# Altium integrated library GPDSE.IntLib: 634 symbols (part 3 of 7) (continued)
## ATmega328A-PU (continued)

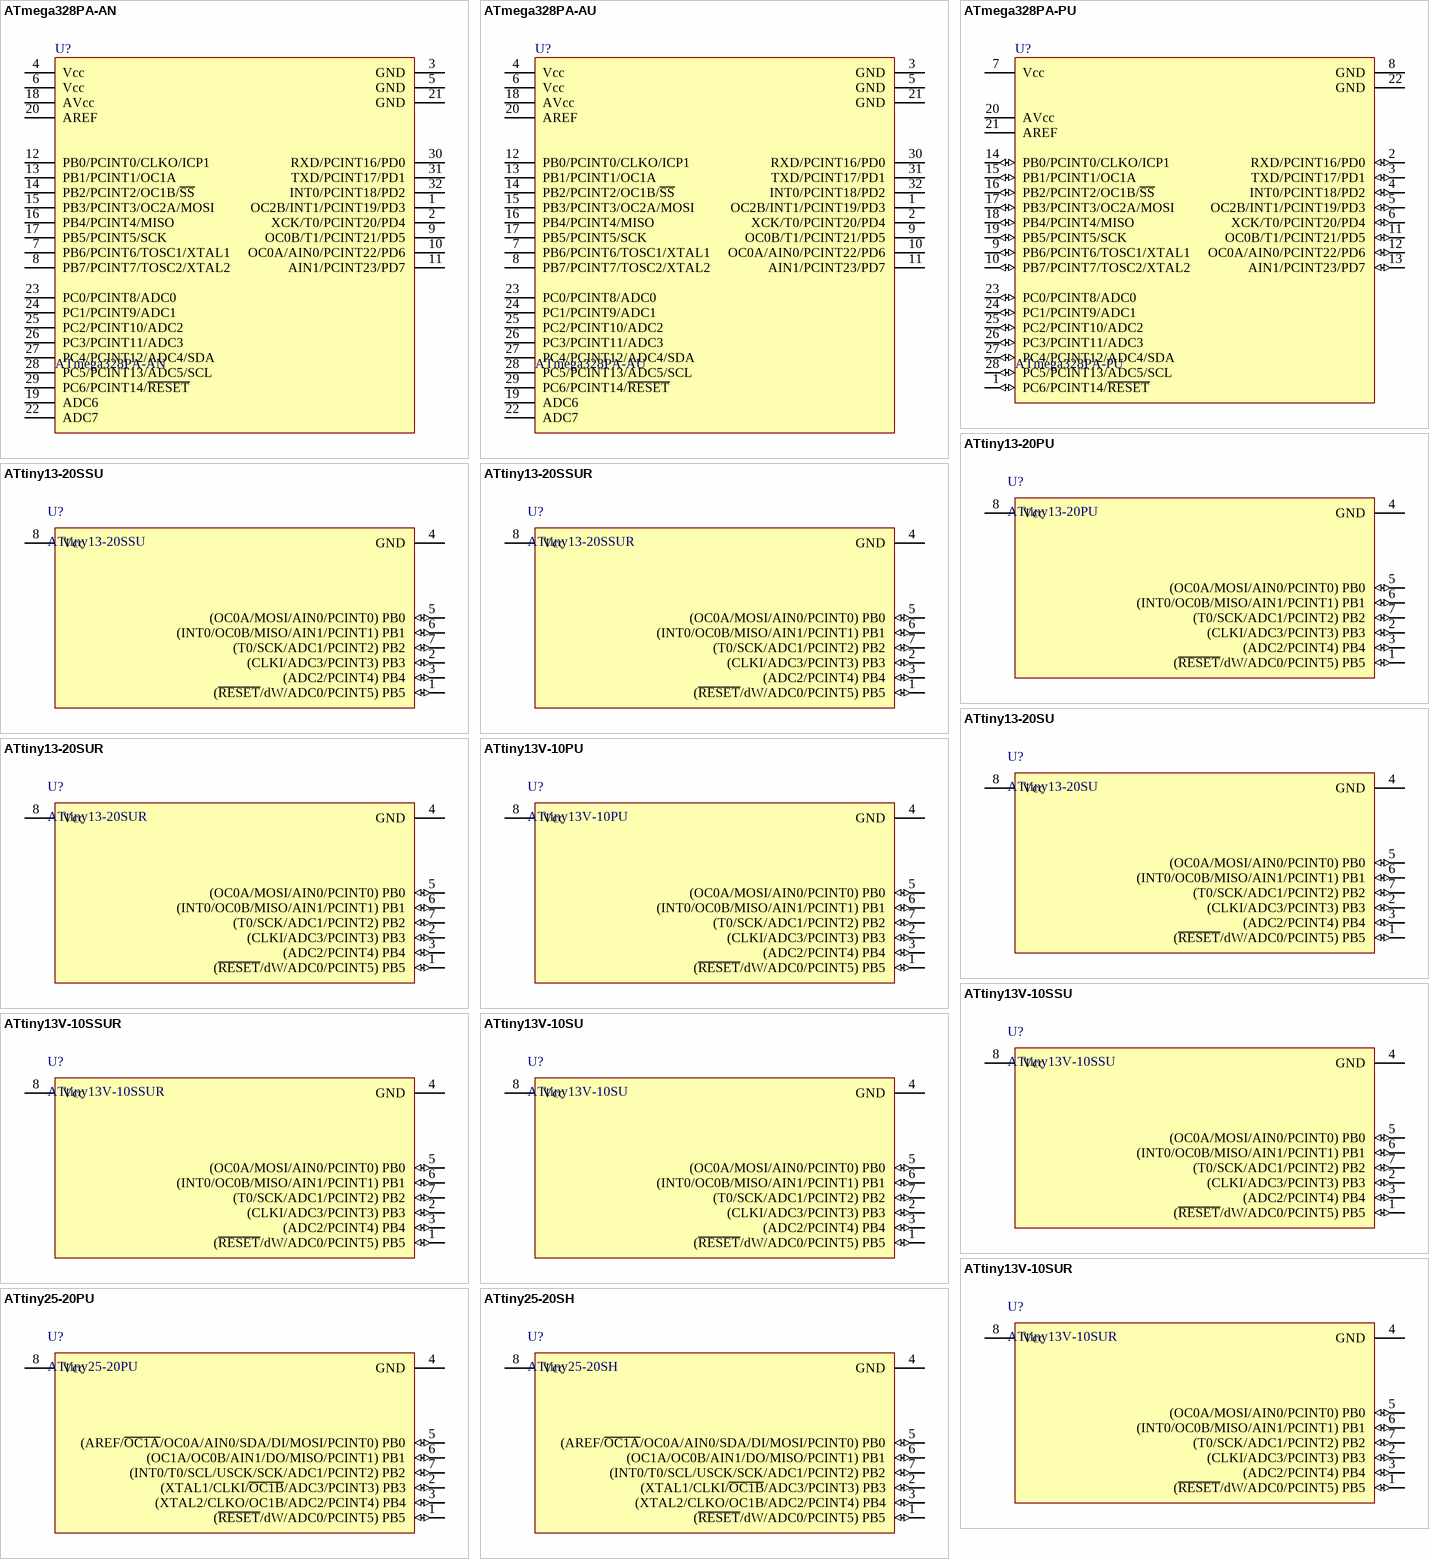
[diagram p15: symbols ATmega328PA-AN to ATtiny25-20SH]

## ATmega328PA-AN
designator U?
8-bit AVR Microcontroller with 32 KB In-System Programmable Flash; Flash Memory: 32 KB; EEPROM Memory: 1 KB; SRAM Memory: 2 KB; Timer 8 bits: 2; Timer 16 bits: 1; PWM Channel: 6; ADC Channel: 8; I/O Pins: 23; Supply Voltage (Vdd): 1.8 - 5.5 V; Clock Frequency: 0 - 20 MHz; Debug: debugWire; Serial USART: 1; Serial SPI: 1; Serial I2C: 1; Analog Comparator: 1
footprint QFP32-7.0mm(0.8mm)
pins: 1 OC2B/INT1/PCINT19/PD3, 2 XCK/T0/PCINT20/PD4, 3 GND, 4 Vcc, 5 GND, 6 Vcc, 7 PB6/PCINT6/TOSC1/XTAL1, 8 PB7/PCINT7/TOSC2/XTAL2, 9 OC0B/T1/PCINT21/PD5, 10 OC0A/AIN0/PCINT22/PD6, 11 AIN1/PCINT23/PD7, 12 PB0/PCINT0/CLKO/ICP1, 13 PB1/PCINT1/OC1A, 14 PB2/PCINT2/OC1B/~{SS}, 15 PB3/PCINT3/OC2A/MOSI, 16 PB4/PCINT4/MISO, 17 PB5/PCINT5/SCK, 18 AVcc, 19 ADC6, 20 AREF, 21 GND, 22 ADC7, 23 PC0/PCINT8/ADC0, 24 PC1/PCINT9/ADC1, 25 PC2/PCINT10/ADC2, 26 PC3/PCINT11/ADC3, 27 PC4/PCINT12/ADC4/SDA, 28 PC5/PCINT13/ADC5/SCL, 29 PC6/PCINT14/~{RESET}, 30 RXD/PCINT16/PD0, 31 TXD/PCINT17/PD1, 32 INT0/PCINT18/PD2

## ATmega328PA-AU
designator U?
8-bit AVR Microcontroller with 32 KB In-System Programmable Flash; Flash Memory: 32 KB; EEPROM Memory: 1 KB; SRAM Memory: 2 KB; Timer 8 bits: 2; Timer 16 bits: 1; PWM Channel: 6; ADC Channel: 8; I/O Pins: 23; Supply Voltage (Vdd): 1.8 - 5.5 V; Clock Frequency: 0 - 20 MHz; Debug: debugWire; Serial USART: 1; Serial SPI: 1; Serial I2C: 1; Analog Comparator: 1
footprint QFP32-7.0mm(0.8mm)
pins: 1 OC2B/INT1/PCINT19/PD3, 2 XCK/T0/PCINT20/PD4, 3 GND, 4 Vcc, 5 GND, 6 Vcc, 7 PB6/PCINT6/TOSC1/XTAL1, 8 PB7/PCINT7/TOSC2/XTAL2, 9 OC0B/T1/PCINT21/PD5, 10 OC0A/AIN0/PCINT22/PD6, 11 AIN1/PCINT23/PD7, 12 PB0/PCINT0/CLKO/ICP1, 13 PB1/PCINT1/OC1A, 14 PB2/PCINT2/OC1B/~{SS}, 15 PB3/PCINT3/OC2A/MOSI, 16 PB4/PCINT4/MISO, 17 PB5/PCINT5/SCK, 18 AVcc, 19 ADC6, 20 AREF, 21 GND, 22 ADC7, 23 PC0/PCINT8/ADC0, 24 PC1/PCINT9/ADC1, 25 PC2/PCINT10/ADC2, 26 PC3/PCINT11/ADC3, 27 PC4/PCINT12/ADC4/SDA, 28 PC5/PCINT13/ADC5/SCL, 29 PC6/PCINT14/~{RESET}, 30 RXD/PCINT16/PD0, 31 TXD/PCINT17/PD1, 32 INT0/PCINT18/PD2

## ATmega328PA-PU
designator U?
8-bit AVR Microcontroller with 32 KB In-System Programmable Flash; Flash Memory: 32 KB; EEPROM Memory: 1 KB; SRAM Memory: 2 KB; Timer 8 bits: 2; Timer 16 bits: 1; PWM Channel: 6; I/O Pins: 23; Supply Voltage (Vdd): 1.8 - 5.5 V; Clock Frequency: 0 - 20 MHz; Debug: debugWire; ADC Channel: 6; Serial USART: 1; Serial SPI: 1; Serial I2C: 1; Analog Comparator: 1
footprint DIP28-300(100) (DIP, 28-Leads, Row Spacing 7.62mm, Pitch 2.54mm, Body 34.67x7.3mm)
pins: 1 PC6/PCINT14/~{RESET} (io), 2 RXD/PCINT16/PD0 (io), 3 TXD/PCINT17/PD1 (io), 4 INT0/PCINT18/PD2 (io), 5 OC2B/INT1/PCINT19/PD3 (io), 6 XCK/T0/PCINT20/PD4 (io), 7 Vcc, 8 GND, 9 PB6/PCINT6/TOSC1/XTAL1 (io), 10 PB7/PCINT7/TOSC2/XTAL2 (io), 11 OC0B/T1/PCINT21/PD5 (io), 12 OC0A/AIN0/PCINT22/PD6 (io), 13 AIN1/PCINT23/PD7 (io), 14 PB0/PCINT0/CLKO/ICP1 (io), 15 PB1/PCINT1/OC1A (io), 16 PB2/PCINT2/OC1B/~{SS} (io), 17 PB3/PCINT3/OC2A/MOSI (io), 18 PB4/PCINT4/MISO (io), 19 PB5/PCINT5/SCK (io), 20 AVcc, 21 AREF, 22 GND, 23 PC0/PCINT8/ADC0 (io), 24 PC1/PCINT9/ADC1 (io), 25 PC2/PCINT10/ADC2 (io), 26 PC3/PCINT11/ADC3 (io), 27 PC4/PCINT12/ADC4/SDA (io), 28 PC5/PCINT13/ADC5/SCL (io)

## ATtiny13-20PU
designator U?
Atmel 8-bit AVR Microcontroller with 1 KB In-System Programmable Flash; ADC Channel: 4; Analog Comparator: 1; Clock Frequency: 0 - 20 MHz; Debug: debugWire; EEPROM Memory: 64 B; Flash Memory: 1 KB; I/O Pins: 6; PWM Channel: 2; Serial USI: 0; Supply Voltage (Vdd): 2.7 - 5.5 V; SRAM Memory: 64 B; Timer 8 bits: 1
footprint DIP08-300(100) (DIP; 8 Leads; Row Spacing 7.62 mm; Pitch 2.54 mm; 3D CircuitWorks)
pins: 1 (~{RESET}/dW/ADC0/PCINT5) PB5 (io), 2 (CLKI/ADC3/PCINT3) PB3 (io), 3 (ADC2/PCINT4) PB4 (io), 4 GND (power), 5 (OC0A/MOSI/AIN0/PCINT0) PB0 (io), 6 (INT0/OC0B/MISO/AIN1/PCINT1) PB1 (io), 7 (T0/SCK/ADC1/PCINT2) PB2 (io), 8 Vcc (power)

## ATtiny13-20SSU
designator U?
Atmel 8-bit AVR Microcontroller with 1 KB In-System Programmable Flash; ADC Channel: 4; Analog Comparator: 1; Clock Frequency: 0 - 20 MHz; Debug: debugWire; EEPROM Memory: 64 B; Flash Memory: 1 KB; I/O Pins: 6; PWM Channel: 2; Serial USI: 0; Supply Voltage (Vdd): 2.7 - 5.5 V; SRAM Memory: 64 B; Timer 8 bits: 1
footprint SOIC08-150(50) (SOIC 8 Leads; Row Spacing 3.81 mm; Pitch 1.27 mm; 3D André L´Hérault)
pins: 1 (~{RESET}/dW/ADC0/PCINT5) PB5 (io), 2 (CLKI/ADC3/PCINT3) PB3 (io), 3 (ADC2/PCINT4) PB4 (io), 4 GND (power), 5 (OC0A/MOSI/AIN0/PCINT0) PB0 (io), 6 (INT0/OC0B/MISO/AIN1/PCINT1) PB1 (io), 7 (T0/SCK/ADC1/PCINT2) PB2 (io), 8 Vcc (power)

## ATtiny13-20SSUR
designator U?
Atmel 8-bit AVR Microcontroller with 1 KB In-System Programmable Flash; ADC Channel: 4; Analog Comparator: 1; Clock Frequency: 0 - 20 MHz; Debug: debugWire; EEPROM Memory: 64 B; Flash Memory: 1 KB; I/O Pins: 6; PWM Channel: 2; Serial USI: 0; Supply Voltage (Vdd): 2.7 - 5.5 V; SRAM Memory: 64 B; Timer 8 bits: 1
footprint SOIC08-150(50) (SOIC 8 Leads; Row Spacing 3.81 mm; Pitch 1.27 mm; 3D André L´Hérault)
pins: 1 (~{RESET}/dW/ADC0/PCINT5) PB5 (io), 2 (CLKI/ADC3/PCINT3) PB3 (io), 3 (ADC2/PCINT4) PB4 (io), 4 GND (power), 5 (OC0A/MOSI/AIN0/PCINT0) PB0 (io), 6 (INT0/OC0B/MISO/AIN1/PCINT1) PB1 (io), 7 (T0/SCK/ADC1/PCINT2) PB2 (io), 8 Vcc (power)

## ATtiny13-20SU
designator U?
Atmel 8-bit AVR Microcontroller with 1 KB In-System Programmable Flash; ADC Channel: 4; Analog Comparator: 1; Clock Frequency: 0 - 20 MHz; Debug: debugWire; EEPROM Memory: 64 B; Flash Memory: 1 KB; I/O Pins: 6; PWM Channel: 2; Serial USI: 0; Supply Voltage (Vdd): 2.7 - 5.5 V; SRAM Memory: 64 B; Timer 8 bits: 1
footprint SOP08-5.3mm(1.27mm) (Small Outline Package 8 pin)
pins: 1 (~{RESET}/dW/ADC0/PCINT5) PB5 (io), 2 (CLKI/ADC3/PCINT3) PB3 (io), 3 (ADC2/PCINT4) PB4 (io), 4 GND (power), 5 (OC0A/MOSI/AIN0/PCINT0) PB0 (io), 6 (INT0/OC0B/MISO/AIN1/PCINT1) PB1 (io), 7 (T0/SCK/ADC1/PCINT2) PB2 (io), 8 Vcc (power)

## ATtiny13-20SUR
designator U?
Atmel 8-bit AVR Microcontroller with 1 KB In-System Programmable Flash; ADC Channel: 4; Analog Comparator: 1; Clock Frequency: 0 - 20 MHz; Debug: debugWire; EEPROM Memory: 64 B; Flash Memory: 1 KB; I/O Pins: 6; PWM Channel: 2; Serial USI: 0; Supply Voltage (Vdd): 2.7 - 5.5 V; SRAM Memory: 64 B; Timer 8 bits: 1
footprint SOP08-5.3mm(1.27mm) (Small Outline Package 8 pin)
pins: 1 (~{RESET}/dW/ADC0/PCINT5) PB5 (io), 2 (CLKI/ADC3/PCINT3) PB3 (io), 3 (ADC2/PCINT4) PB4 (io), 4 GND (power), 5 (OC0A/MOSI/AIN0/PCINT0) PB0 (io), 6 (INT0/OC0B/MISO/AIN1/PCINT1) PB1 (io), 7 (T0/SCK/ADC1/PCINT2) PB2 (io), 8 Vcc (power)

## ATtiny13V-10PU
designator U?
Atmel 8-bit AVR Microcontroller with 1 KB In-System Programmable Flash; ADC Channel: 4; Analog Comparator: 1; Clock Frequency: 0 - 10 MHz; Debug: debugWire; EEPROM Memory: 64 B; Flash Memory: 1 KB; I/O Pins: 6; PWM Channel: 2; Serial USI: 0; Supply Voltage (Vdd): 1.8 - 5.5 V; SRAM Memory: 64 B; Timer 8 bits: 1
footprint DIP08-300(100) (DIP; 8 Leads; Row Spacing 7.62 mm; Pitch 2.54 mm; 3D CircuitWorks)
pins: 1 (~{RESET}/dW/ADC0/PCINT5) PB5 (io), 2 (CLKI/ADC3/PCINT3) PB3 (io), 3 (ADC2/PCINT4) PB4 (io), 4 GND (power), 5 (OC0A/MOSI/AIN0/PCINT0) PB0 (io), 6 (INT0/OC0B/MISO/AIN1/PCINT1) PB1 (io), 7 (T0/SCK/ADC1/PCINT2) PB2 (io), 8 Vcc (power)

## ATtiny13V-10SSU
designator U?
Atmel 8-bit AVR Microcontroller with 1 KB In-System Programmable Flash; ADC Channel: 4; Analog Comparator: 1; Clock Frequency: 0 - 10 MHz; Debug: debugWire; EEPROM Memory: 64 B; Flash Memory: 1 KB; I/O Pins: 6; PWM Channel: 2; Serial USI: 0; Supply Voltage (Vdd): 1.8 - 5.5 V; SRAM Memory: 64 B; Timer 8 bits: 1
footprint SOIC08-150(50) (SOIC 8 Leads; Row Spacing 3.81 mm; Pitch 1.27 mm; 3D André L´Hérault)
pins: 1 (~{RESET}/dW/ADC0/PCINT5) PB5 (io), 2 (CLKI/ADC3/PCINT3) PB3 (io), 3 (ADC2/PCINT4) PB4 (io), 4 GND (power), 5 (OC0A/MOSI/AIN0/PCINT0) PB0 (io), 6 (INT0/OC0B/MISO/AIN1/PCINT1) PB1 (io), 7 (T0/SCK/ADC1/PCINT2) PB2 (io), 8 Vcc (power)

## ATtiny13V-10SSUR
designator U?
Atmel 8-bit AVR Microcontroller with 1 KB In-System Programmable Flash; ADC Channel: 4; Analog Comparator: 1; Clock Frequency: 0 - 10 MHz; Debug: debugWire; EEPROM Memory: 64 B; Flash Memory: 1 KB; I/O Pins: 6; PWM Channel: 2; Serial USI: 0; Supply Voltage (Vdd): 1.8 - 5.5 V; SRAM Memory: 64 B; Timer 8 bits: 1
footprint SOIC08-150(50) (SOIC 8 Leads; Row Spacing 3.81 mm; Pitch 1.27 mm; 3D André L´Hérault)
pins: 1 (~{RESET}/dW/ADC0/PCINT5) PB5 (io), 2 (CLKI/ADC3/PCINT3) PB3 (io), 3 (ADC2/PCINT4) PB4 (io), 4 GND (power), 5 (OC0A/MOSI/AIN0/PCINT0) PB0 (io), 6 (INT0/OC0B/MISO/AIN1/PCINT1) PB1 (io), 7 (T0/SCK/ADC1/PCINT2) PB2 (io), 8 Vcc (power)

## ATtiny13V-10SU
designator U?
Atmel 8-bit AVR Microcontroller with 1 KB In-System Programmable Flash; ADC Channel: 4; Analog Comparator: 1; Clock Frequency: 0 - 10 MHz; Debug: debugWire; EEPROM Memory: 64 B; Flash Memory: 1 KB; I/O Pins: 6; PWM Channel: 2; Serial USI: 0; Supply Voltage (Vdd): 1.8 - 5.5 V; SRAM Memory: 64 B; Timer 8 bits: 1
footprint SOP08-5.3mm(1.27mm) (Small Outline Package 8 pin)
pins: 1 (~{RESET}/dW/ADC0/PCINT5) PB5 (io), 2 (CLKI/ADC3/PCINT3) PB3 (io), 3 (ADC2/PCINT4) PB4 (io), 4 GND (power), 5 (OC0A/MOSI/AIN0/PCINT0) PB0 (io), 6 (INT0/OC0B/MISO/AIN1/PCINT1) PB1 (io), 7 (T0/SCK/ADC1/PCINT2) PB2 (io), 8 Vcc (power)

## ATtiny13V-10SUR
designator U?
Atmel 8-bit AVR Microcontroller with 1 KB In-System Programmable Flash; ADC Channel: 4; Analog Comparator: 1; Clock Frequency: 0 - 10 MHz; Debug: debugWire; EEPROM Memory: 64 B; Flash Memory: 1 KB; I/O Pins: 6; PWM Channel: 2; Serial USI: 0; Supply Voltage (Vdd): 1.8 - 5.5 V; SRAM Memory: 64 B; Timer 8 bits: 1
footprint SOP08-5.3mm(1.27mm) (Small Outline Package 8 pin)
pins: 1 (~{RESET}/dW/ADC0/PCINT5) PB5 (io), 2 (CLKI/ADC3/PCINT3) PB3 (io), 3 (ADC2/PCINT4) PB4 (io), 4 GND (power), 5 (OC0A/MOSI/AIN0/PCINT0) PB0 (io), 6 (INT0/OC0B/MISO/AIN1/PCINT1) PB1 (io), 7 (T0/SCK/ADC1/PCINT2) PB2 (io), 8 Vcc (power)

## ATtiny25-20PU
designator U?
Atmel 8-bit AVR Microcontroller with 2 KB In-System Programmable Flash; ADC Channel: 4; Clock Frequency: 0 - 20 MHz; Debug: debugWire; EEPROM Memory: 128 B; Flash Memory: 2 KB; I/O Pins: 6; PWM Channel: 2; Serial USI: 1; Supply Voltage (Vdd): 2.7 - 5.5 V; Analog Comparator: *; SRAM Memory: 128 B; Timer 8 bits: 1
footprint DIP08-300(100) (DIP; 8 Leads; Row Spacing 7.62 mm; Pitch 2.54 mm; 3D CircuitWorks)
pins: 1 (~{RESET}/dW/ADC0/PCINT5) PB5 (io), 2 (XTAL1/CLKI/~{OC1B}/ADC3/PCINT3) PB3 (io), 3 (XTAL2/CLKO/OC1B/ADC2/PCINT4) PB4 (io), 4 GND (power), 5 (AREF/~{OC1A}/OC0A/AIN0/SDA/DI/MOSI/PCINT0) PB0 (io), 6 (OC1A/OC0B/AIN1/DO/MISO/PCINT1) PB1 (io), 7 (INT0/T0/SCL/USCK/SCK/ADC1/PCINT2) PB2 (io), 8 Vcc (power)

## ATtiny25-20SH
designator U?
Atmel 8-bit AVR Microcontroller with 2 KB In-System Programmable Flash; ADC Channel: 4; Clock Frequency: 0 - 20 MHz; Debug: debugWire; EEPROM Memory: 128 B; Flash Memory: 2 KB; I/O Pins: 6; PWM Channel: 2; Serial USI: 1; Supply Voltage (Vdd): 2.7 - 5.5 V; Analog Comparator: *; SRAM Memory: 128 B; Timer 8 bits: 1
footprint SOP08-5.3mm(1.27mm) (Small Outline Package 8 pin)
pins: 1 (~{RESET}/dW/ADC0/PCINT5) PB5 (io), 2 (XTAL1/CLKI/~{OC1B}/ADC3/PCINT3) PB3 (io), 3 (XTAL2/CLKO/OC1B/ADC2/PCINT4) PB4 (io), 4 GND (power), 5 (AREF/~{OC1A}/OC0A/AIN0/SDA/DI/MOSI/PCINT0) PB0 (io), 6 (OC1A/OC0B/AIN1/DO/MISO/PCINT1) PB1 (io), 7 (INT0/T0/SCL/USCK/SCK/ADC1/PCINT2) PB2 (io), 8 Vcc (power)

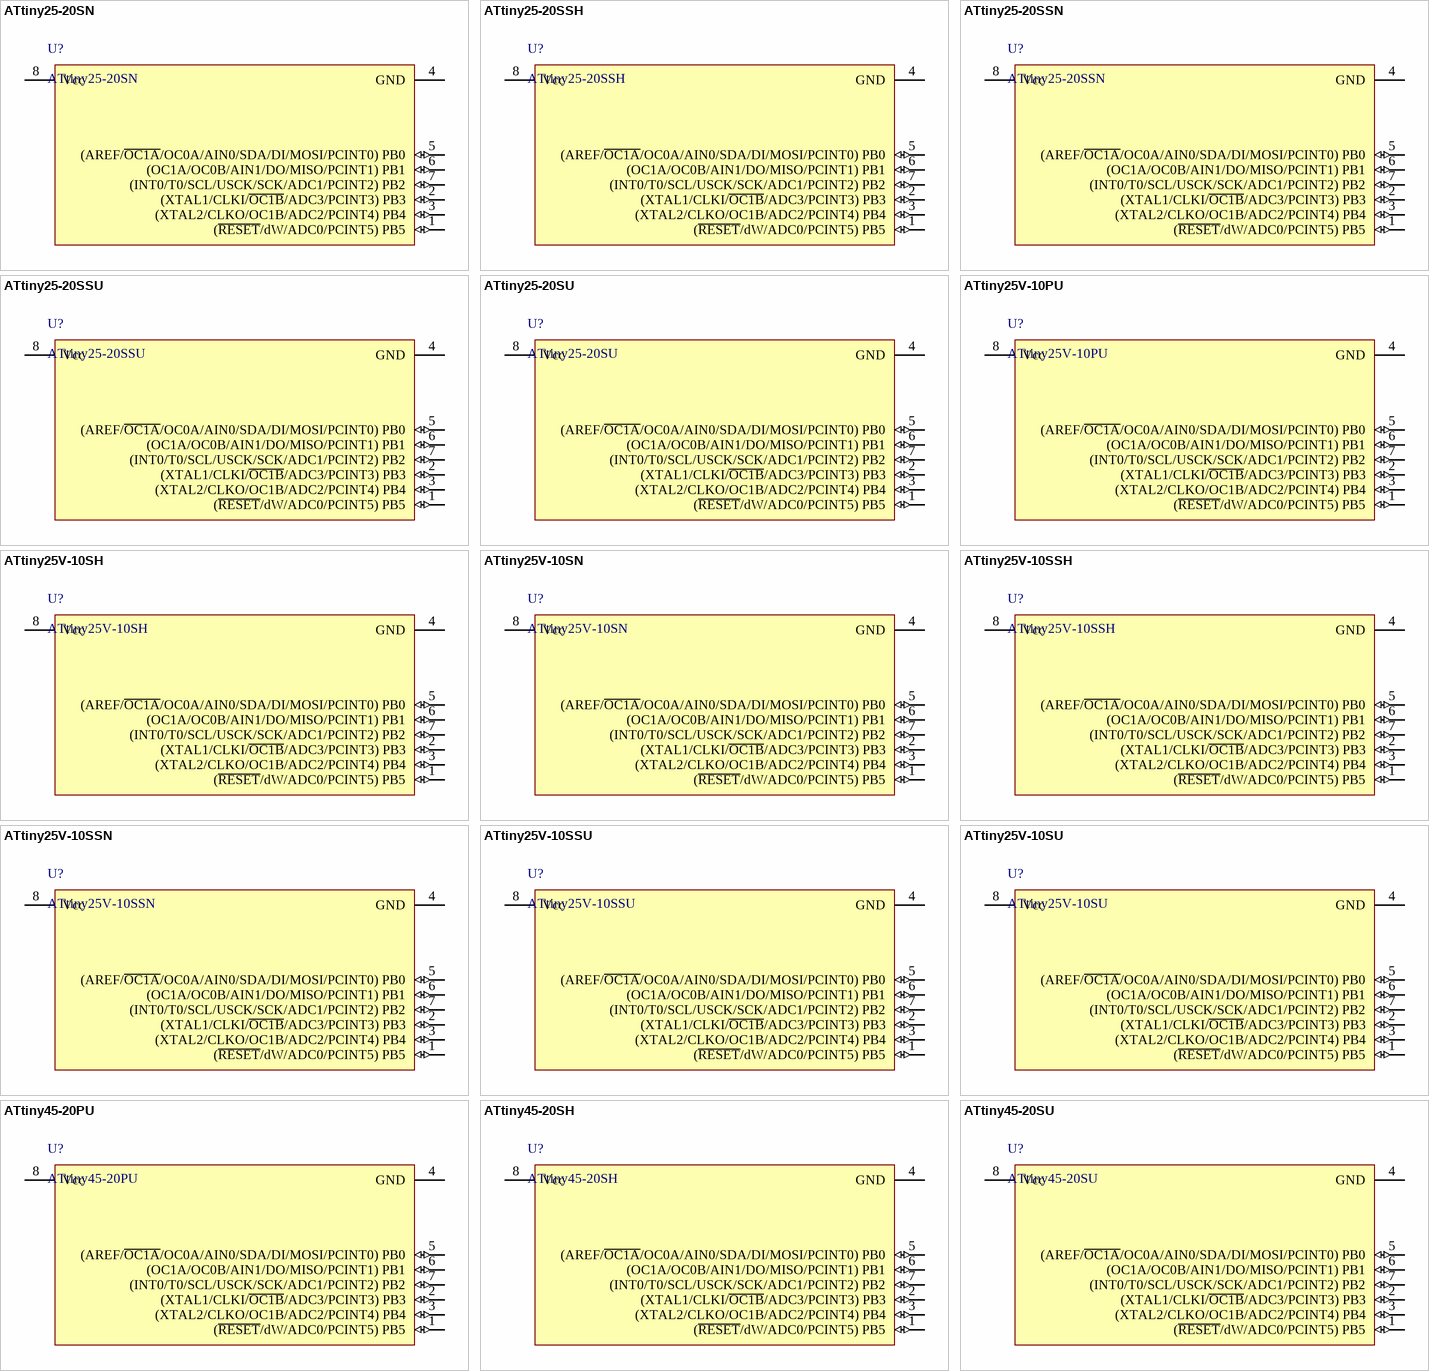
[diagram p16: symbols ATtiny25-20SN to ATtiny45-20SU]

## ATtiny25-20SN
designator U?
Atmel 8-bit AVR Microcontroller with 2 KB In-System Programmable Flash; ADC Channel: 4; Clock Frequency: 0 - 20 MHz; Debug: debugWire; EEPROM Memory: 128 B; Flash Memory: 2 KB; I/O Pins: 6; PWM Channel: 2; Serial USI: 1; Supply Voltage (Vdd): 2.7 - 5.5 V; Analog Comparator: *; SRAM Memory: 128 B; Timer 8 bits: 1
footprint SOP08-5.3mm(1.27mm) (Small Outline Package 8 pin)
pins: 1 (~{RESET}/dW/ADC0/PCINT5) PB5 (io), 2 (XTAL1/CLKI/~{OC1B}/ADC3/PCINT3) PB3 (io), 3 (XTAL2/CLKO/OC1B/ADC2/PCINT4) PB4 (io), 4 GND (power), 5 (AREF/~{OC1A}/OC0A/AIN0/SDA/DI/MOSI/PCINT0) PB0 (io), 6 (OC1A/OC0B/AIN1/DO/MISO/PCINT1) PB1 (io), 7 (INT0/T0/SCL/USCK/SCK/ADC1/PCINT2) PB2 (io), 8 Vcc (power)

## ATtiny25-20SSH
designator U?
Atmel 8-bit AVR Microcontroller with 2 KB In-System Programmable Flash; ADC Channel: 4; Clock Frequency: 0 - 20 MHz; Debug: debugWire; EEPROM Memory: 128 B; Flash Memory: 2 KB; I/O Pins: 6; PWM Channel: 2; Serial USI: 1; Supply Voltage (Vdd): 2.7 - 5.5 V; Analog Comparator: *; SRAM Memory: 128 B; Timer 8 bits: 1
footprint SOIC08-150(50) (SOIC 8 Leads; Row Spacing 3.81 mm; Pitch 1.27 mm; 3D André L´Hérault)
pins: 1 (~{RESET}/dW/ADC0/PCINT5) PB5 (io), 2 (XTAL1/CLKI/~{OC1B}/ADC3/PCINT3) PB3 (io), 3 (XTAL2/CLKO/OC1B/ADC2/PCINT4) PB4 (io), 4 GND (power), 5 (AREF/~{OC1A}/OC0A/AIN0/SDA/DI/MOSI/PCINT0) PB0 (io), 6 (OC1A/OC0B/AIN1/DO/MISO/PCINT1) PB1 (io), 7 (INT0/T0/SCL/USCK/SCK/ADC1/PCINT2) PB2 (io), 8 Vcc (power)

## ATtiny25-20SSN
designator U?
Atmel 8-bit AVR Microcontroller with 2 KB In-System Programmable Flash; ADC Channel: 4; Clock Frequency: 0 - 20 MHz; Debug: debugWire; EEPROM Memory: 128 B; Flash Memory: 2 KB; I/O Pins: 6; PWM Channel: 2; Serial USI: 1; Supply Voltage (Vdd): 2.7 - 5.5 V; Analog Comparator: *; SRAM Memory: 128 B; Timer 8 bits: 1
footprint SOIC08-150(50) (SOIC 8 Leads; Row Spacing 3.81 mm; Pitch 1.27 mm; 3D André L´Hérault)
pins: 1 (~{RESET}/dW/ADC0/PCINT5) PB5 (io), 2 (XTAL1/CLKI/~{OC1B}/ADC3/PCINT3) PB3 (io), 3 (XTAL2/CLKO/OC1B/ADC2/PCINT4) PB4 (io), 4 GND (power), 5 (AREF/~{OC1A}/OC0A/AIN0/SDA/DI/MOSI/PCINT0) PB0 (io), 6 (OC1A/OC0B/AIN1/DO/MISO/PCINT1) PB1 (io), 7 (INT0/T0/SCL/USCK/SCK/ADC1/PCINT2) PB2 (io), 8 Vcc (power)

## ATtiny25-20SSU
designator U?
Atmel 8-bit AVR Microcontroller with 2 KB In-System Programmable Flash; ADC Channel: 4; Clock Frequency: 0 - 20 MHz; Debug: debugWire; EEPROM Memory: 128 B; Flash Memory: 2 KB; I/O Pins: 6; PWM Channel: 2; Serial USI: 1; Supply Voltage (Vdd): 2.7 - 5.5 V; Analog Comparator: *; SRAM Memory: 128 B; Timer 8 bits: 1
footprint SOIC08-150(50) (SOIC 8 Leads; Row Spacing 3.81 mm; Pitch 1.27 mm; 3D André L´Hérault)
pins: 1 (~{RESET}/dW/ADC0/PCINT5) PB5 (io), 2 (XTAL1/CLKI/~{OC1B}/ADC3/PCINT3) PB3 (io), 3 (XTAL2/CLKO/OC1B/ADC2/PCINT4) PB4 (io), 4 GND (power), 5 (AREF/~{OC1A}/OC0A/AIN0/SDA/DI/MOSI/PCINT0) PB0 (io), 6 (OC1A/OC0B/AIN1/DO/MISO/PCINT1) PB1 (io), 7 (INT0/T0/SCL/USCK/SCK/ADC1/PCINT2) PB2 (io), 8 Vcc (power)

## ATtiny25-20SU
designator U?
Atmel 8-bit AVR Microcontroller with 2 KB In-System Programmable Flash; ADC Channel: 4; Clock Frequency: 0 - 20 MHz; Debug: debugWire; EEPROM Memory: 128 B; Flash Memory: 2 KB; I/O Pins: 6; PWM Channel: 2; Serial USI: 1; Supply Voltage (Vdd): 2.7 - 5.5 V; Analog Comparator: *; SRAM Memory: 128 B; Timer 8 bits: 1
footprint SOP08-5.3mm(1.27mm) (Small Outline Package 8 pin)
pins: 1 (~{RESET}/dW/ADC0/PCINT5) PB5 (io), 2 (XTAL1/CLKI/~{OC1B}/ADC3/PCINT3) PB3 (io), 3 (XTAL2/CLKO/OC1B/ADC2/PCINT4) PB4 (io), 4 GND (power), 5 (AREF/~{OC1A}/OC0A/AIN0/SDA/DI/MOSI/PCINT0) PB0 (io), 6 (OC1A/OC0B/AIN1/DO/MISO/PCINT1) PB1 (io), 7 (INT0/T0/SCL/USCK/SCK/ADC1/PCINT2) PB2 (io), 8 Vcc (power)

## ATtiny25V-10PU
designator U?
Atmel 8-bit AVR Microcontroller with 2 KB In-System Programmable Flash; ADC Channel: 4; Clock Frequency: 0 - 10 MHz; Debug: debugWire; EEPROM Memory: 128 B; Flash Memory: 2 KB; I/O Pins: 6; PWM Channel: 2; Serial USI: 1; Supply Voltage (Vdd): 1.8 - 5.5 V; Analog Comparator: *; SRAM Memory: 128 B; Timer 8 bits: 1
footprint DIP08-300(100) (DIP; 8 Leads; Row Spacing 7.62 mm; Pitch 2.54 mm; 3D CircuitWorks)
pins: 1 (~{RESET}/dW/ADC0/PCINT5) PB5 (io), 2 (XTAL1/CLKI/~{OC1B}/ADC3/PCINT3) PB3 (io), 3 (XTAL2/CLKO/OC1B/ADC2/PCINT4) PB4 (io), 4 GND (power), 5 (AREF/~{OC1A}/OC0A/AIN0/SDA/DI/MOSI/PCINT0) PB0 (io), 6 (OC1A/OC0B/AIN1/DO/MISO/PCINT1) PB1 (io), 7 (INT0/T0/SCL/USCK/SCK/ADC1/PCINT2) PB2 (io), 8 Vcc (power)

## ATtiny25V-10SH
designator U?
Atmel 8-bit AVR Microcontroller with 2 KB In-System Programmable Flash; ADC Channel: 4; Clock Frequency: 0 - 10 MHz; Debug: debugWire; EEPROM Memory: 128 B; Flash Memory: 2 KB; I/O Pins: 6; PWM Channel: 2; Serial USI: 1; Supply Voltage (Vdd): 1.8 - 5.5 V; Analog Comparator: *; SRAM Memory: 128 B; Timer 8 bits: 1
footprint SOP08-5.3mm(1.27mm) (Small Outline Package 8 pin)
pins: 1 (~{RESET}/dW/ADC0/PCINT5) PB5 (io), 2 (XTAL1/CLKI/~{OC1B}/ADC3/PCINT3) PB3 (io), 3 (XTAL2/CLKO/OC1B/ADC2/PCINT4) PB4 (io), 4 GND (power), 5 (AREF/~{OC1A}/OC0A/AIN0/SDA/DI/MOSI/PCINT0) PB0 (io), 6 (OC1A/OC0B/AIN1/DO/MISO/PCINT1) PB1 (io), 7 (INT0/T0/SCL/USCK/SCK/ADC1/PCINT2) PB2 (io), 8 Vcc (power)

## ATtiny25V-10SN
designator U?
Atmel 8-bit AVR Microcontroller with 2 KB In-System Programmable Flash; ADC Channel: 4; Clock Frequency: 0 - 10 MHz; Debug: debugWire; EEPROM Memory: 128 B; Flash Memory: 2 KB; I/O Pins: 6; PWM Channel: 2; Serial USI: 1; Supply Voltage (Vdd): 1.8 - 5.5 V; Analog Comparator: *; SRAM Memory: 128 B; Timer 8 bits: 1
footprint SOP08-5.3mm(1.27mm) (Small Outline Package 8 pin)
pins: 1 (~{RESET}/dW/ADC0/PCINT5) PB5 (io), 2 (XTAL1/CLKI/~{OC1B}/ADC3/PCINT3) PB3 (io), 3 (XTAL2/CLKO/OC1B/ADC2/PCINT4) PB4 (io), 4 GND (power), 5 (AREF/~{OC1A}/OC0A/AIN0/SDA/DI/MOSI/PCINT0) PB0 (io), 6 (OC1A/OC0B/AIN1/DO/MISO/PCINT1) PB1 (io), 7 (INT0/T0/SCL/USCK/SCK/ADC1/PCINT2) PB2 (io), 8 Vcc (power)

## ATtiny25V-10SSH
designator U?
Atmel 8-bit AVR Microcontroller with 2 KB In-System Programmable Flash; ADC Channel: 4; Clock Frequency: 0 - 10 MHz; Debug: debugWire; EEPROM Memory: 128 B; Flash Memory: 2 KB; I/O Pins: 6; PWM Channel: 2; Serial USI: 1; Supply Voltage (Vdd): 1.8 - 5.5 V; Analog Comparator: *; SRAM Memory: 128 B; Timer 8 bits: 1
footprint SOIC08-150(50) (SOIC 8 Leads; Row Spacing 3.81 mm; Pitch 1.27 mm; 3D André L´Hérault)
pins: 1 (~{RESET}/dW/ADC0/PCINT5) PB5 (io), 2 (XTAL1/CLKI/~{OC1B}/ADC3/PCINT3) PB3 (io), 3 (XTAL2/CLKO/OC1B/ADC2/PCINT4) PB4 (io), 4 GND (power), 5 (AREF/~{OC1A}/OC0A/AIN0/SDA/DI/MOSI/PCINT0) PB0 (io), 6 (OC1A/OC0B/AIN1/DO/MISO/PCINT1) PB1 (io), 7 (INT0/T0/SCL/USCK/SCK/ADC1/PCINT2) PB2 (io), 8 Vcc (power)

## ATtiny25V-10SSN
designator U?
Atmel 8-bit AVR Microcontroller with 2 KB In-System Programmable Flash; ADC Channel: 4; Clock Frequency: 0 - 10 MHz; Debug: debugWire; EEPROM Memory: 128 B; Flash Memory: 2 KB; I/O Pins: 6; PWM Channel: 2; Serial USI: 1; Supply Voltage (Vdd): 1.8 - 5.5 V; Analog Comparator: *; SRAM Memory: 128 B; Timer 8 bits: 1
footprint SOIC08-150(50) (SOIC 8 Leads; Row Spacing 3.81 mm; Pitch 1.27 mm; 3D André L´Hérault)
pins: 1 (~{RESET}/dW/ADC0/PCINT5) PB5 (io), 2 (XTAL1/CLKI/~{OC1B}/ADC3/PCINT3) PB3 (io), 3 (XTAL2/CLKO/OC1B/ADC2/PCINT4) PB4 (io), 4 GND (power), 5 (AREF/~{OC1A}/OC0A/AIN0/SDA/DI/MOSI/PCINT0) PB0 (io), 6 (OC1A/OC0B/AIN1/DO/MISO/PCINT1) PB1 (io), 7 (INT0/T0/SCL/USCK/SCK/ADC1/PCINT2) PB2 (io), 8 Vcc (power)

## ATtiny25V-10SSU
designator U?
Atmel 8-bit AVR Microcontroller with 2 KB In-System Programmable Flash; ADC Channel: 4; Clock Frequency: 0 - 10 MHz; Debug: debugWire; EEPROM Memory: 128 B; Flash Memory: 2 KB; I/O Pins: 6; PWM Channel: 2; Serial USI: 1; Supply Voltage (Vdd): 1.8 - 5.5 V; Analog Comparator: *; SRAM Memory: 128 B; Timer 8 bits: 1
footprint SOIC08-150(50) (SOIC 8 Leads; Row Spacing 3.81 mm; Pitch 1.27 mm; 3D André L´Hérault)
pins: 1 (~{RESET}/dW/ADC0/PCINT5) PB5 (io), 2 (XTAL1/CLKI/~{OC1B}/ADC3/PCINT3) PB3 (io), 3 (XTAL2/CLKO/OC1B/ADC2/PCINT4) PB4 (io), 4 GND (power), 5 (AREF/~{OC1A}/OC0A/AIN0/SDA/DI/MOSI/PCINT0) PB0 (io), 6 (OC1A/OC0B/AIN1/DO/MISO/PCINT1) PB1 (io), 7 (INT0/T0/SCL/USCK/SCK/ADC1/PCINT2) PB2 (io), 8 Vcc (power)

## ATtiny25V-10SU
designator U?
Atmel 8-bit AVR Microcontroller with 2 KB In-System Programmable Flash; ADC Channel: 4; Clock Frequency: 0 - 10 MHz; Debug: debugWire; EEPROM Memory: 128 B; Flash Memory: 2 KB; I/O Pins: 6; PWM Channel: 2; Serial USI: 1; Supply Voltage (Vdd): 1.8 - 5.5 V; Analog Comparator: *; SRAM Memory: 128 B; Timer 8 bits: 1
footprint SOP08-5.3mm(1.27mm) (Small Outline Package 8 pin)
pins: 1 (~{RESET}/dW/ADC0/PCINT5) PB5 (io), 2 (XTAL1/CLKI/~{OC1B}/ADC3/PCINT3) PB3 (io), 3 (XTAL2/CLKO/OC1B/ADC2/PCINT4) PB4 (io), 4 GND (power), 5 (AREF/~{OC1A}/OC0A/AIN0/SDA/DI/MOSI/PCINT0) PB0 (io), 6 (OC1A/OC0B/AIN1/DO/MISO/PCINT1) PB1 (io), 7 (INT0/T0/SCL/USCK/SCK/ADC1/PCINT2) PB2 (io), 8 Vcc (power)

## ATtiny45-20PU
designator U?
Atmel 8-bit AVR Microcontroller with 4 KB In-System Programmable Flash; ADC Channel: 4; Clock Frequency: 0 - 20 MHz; Debug: debugWire; EEPROM Memory: 256 B; Flash Memory: 4 KB; I/O Pins: 6; PWM Channel: 2; Serial USI: 1; Supply Voltage (Vdd): 2.7 - 5.5 V; Analog Comparator: *; SRAM Memory: 256 B; Timer 8 bits: 1
footprint DIP08-300(100) (DIP; 8 Leads; Row Spacing 7.62 mm; Pitch 2.54 mm; 3D CircuitWorks)
pins: 1 (~{RESET}/dW/ADC0/PCINT5) PB5 (io), 2 (XTAL1/CLKI/~{OC1B}/ADC3/PCINT3) PB3 (io), 3 (XTAL2/CLKO/OC1B/ADC2/PCINT4) PB4 (io), 4 GND (power), 5 (AREF/~{OC1A}/OC0A/AIN0/SDA/DI/MOSI/PCINT0) PB0 (io), 6 (OC1A/OC0B/AIN1/DO/MISO/PCINT1) PB1 (io), 7 (INT0/T0/SCL/USCK/SCK/ADC1/PCINT2) PB2 (io), 8 Vcc (power)

## ATtiny45-20SH
designator U?
Atmel 8-bit AVR Microcontroller with 4 KB In-System Programmable Flash; ADC Channel: 4; Clock Frequency: 0 - 20 MHz; Debug: debugWire; EEPROM Memory: 256 B; Flash Memory: 4 KB; I/O Pins: 6; PWM Channel: 2; Serial USI: 1; Supply Voltage (Vdd): 2.7 - 5.5 V; Analog Comparator: *; SRAM Memory: 256 B; Timer 8 bits: 1
footprint SOP08-5.3mm(1.27mm) (Small Outline Package 8 pin)
pins: 1 (~{RESET}/dW/ADC0/PCINT5) PB5 (io), 2 (XTAL1/CLKI/~{OC1B}/ADC3/PCINT3) PB3 (io), 3 (XTAL2/CLKO/OC1B/ADC2/PCINT4) PB4 (io), 4 GND (power), 5 (AREF/~{OC1A}/OC0A/AIN0/SDA/DI/MOSI/PCINT0) PB0 (io), 6 (OC1A/OC0B/AIN1/DO/MISO/PCINT1) PB1 (io), 7 (INT0/T0/SCL/USCK/SCK/ADC1/PCINT2) PB2 (io), 8 Vcc (power)

## ATtiny45-20SU
designator U?
Atmel 8-bit AVR Microcontroller with 4 KB In-System Programmable Flash; ADC Channel: 4; Clock Frequency: 0 - 20 MHz; Debug: debugWire; EEPROM Memory: 256 B; Flash Memory: 4 KB; I/O Pins: 6; PWM Channel: 2; Serial USI: 1; Supply Voltage (Vdd): 2.7 - 5.5 V; Analog Comparator: *; SRAM Memory: 256 B; Timer 8 bits: 1
footprint SOP08-5.3mm(1.27mm) (Small Outline Package 8 pin)
pins: 1 (~{RESET}/dW/ADC0/PCINT5) PB5 (io), 2 (XTAL1/CLKI/~{OC1B}/ADC3/PCINT3) PB3 (io), 3 (XTAL2/CLKO/OC1B/ADC2/PCINT4) PB4 (io), 4 GND (power), 5 (AREF/~{OC1A}/OC0A/AIN0/SDA/DI/MOSI/PCINT0) PB0 (io), 6 (OC1A/OC0B/AIN1/DO/MISO/PCINT1) PB1 (io), 7 (INT0/T0/SCL/USCK/SCK/ADC1/PCINT2) PB2 (io), 8 Vcc (power)

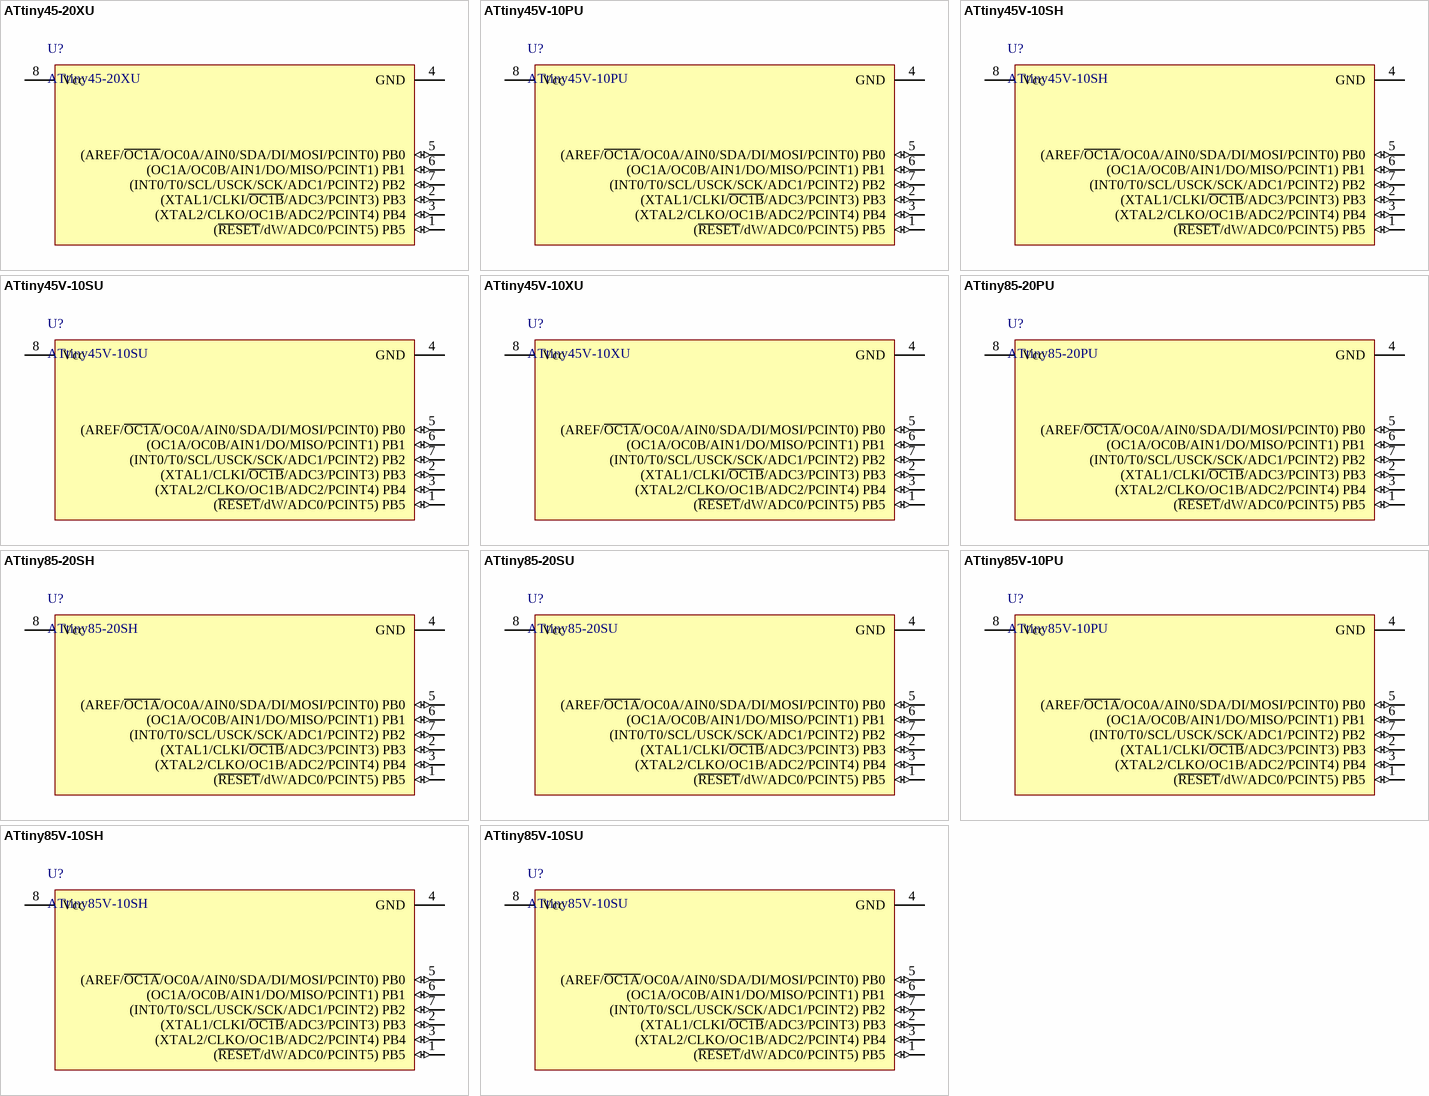
[diagram p17: symbols ATtiny45-20XU to ATtiny85V-10SU]

## ATtiny45-20XU
designator U?
Atmel 8-bit AVR Microcontroller with 4 KB In-System Programmable Flash; ADC Channel: 4; Clock Frequency: 0 - 20 MHz; Debug: debugWire; EEPROM Memory: 256 B; Flash Memory: 4 KB; I/O Pins: 6; PWM Channel: 2; Serial USI: 1; Supply Voltage (Vdd): 2.7 - 5.5 V; Analog Comparator: *; SRAM Memory: 256 B; Timer 8 bits: 1
footprint SOP08-4.4mm(0.65mm) (Thin Shrink Small Outline Package 8 pin)
pins: 1 (~{RESET}/dW/ADC0/PCINT5) PB5 (io), 2 (XTAL1/CLKI/~{OC1B}/ADC3/PCINT3) PB3 (io), 3 (XTAL2/CLKO/OC1B/ADC2/PCINT4) PB4 (io), 4 GND (power), 5 (AREF/~{OC1A}/OC0A/AIN0/SDA/DI/MOSI/PCINT0) PB0 (io), 6 (OC1A/OC0B/AIN1/DO/MISO/PCINT1) PB1 (io), 7 (INT0/T0/SCL/USCK/SCK/ADC1/PCINT2) PB2 (io), 8 Vcc (power)

## ATtiny45V-10PU
designator U?
Atmel 8-bit AVR Microcontroller with 4 KB In-System Programmable Flash; ADC Channel: 4; Clock Frequency: 0 - 10 MHz; Debug: debugWire; EEPROM Memory: 256 B; Flash Memory: 4 KB; I/O Pins: 6; PWM Channel: 2; Serial USI: 1; Supply Voltage (Vdd): 1.8 - 5.5 V; Analog Comparator: *; SRAM Memory: 256 B; Timer 8 bits: 1
footprint DIP08-300(100) (DIP; 8 Leads; Row Spacing 7.62 mm; Pitch 2.54 mm; 3D CircuitWorks)
pins: 1 (~{RESET}/dW/ADC0/PCINT5) PB5 (io), 2 (XTAL1/CLKI/~{OC1B}/ADC3/PCINT3) PB3 (io), 3 (XTAL2/CLKO/OC1B/ADC2/PCINT4) PB4 (io), 4 GND (power), 5 (AREF/~{OC1A}/OC0A/AIN0/SDA/DI/MOSI/PCINT0) PB0 (io), 6 (OC1A/OC0B/AIN1/DO/MISO/PCINT1) PB1 (io), 7 (INT0/T0/SCL/USCK/SCK/ADC1/PCINT2) PB2 (io), 8 Vcc (power)

## ATtiny45V-10SH
designator U?
Atmel 8-bit AVR Microcontroller with 4 KB In-System Programmable Flash; ADC Channel: 4; Clock Frequency: 0 - 10 MHz; Debug: debugWire; EEPROM Memory: 256 B; Flash Memory: 4 KB; I/O Pins: 6; PWM Channel: 2; Serial USI: 1; Supply Voltage (Vdd): 1.8 - 5.5 V; Analog Comparator: *; SRAM Memory: 256 B; Timer 8 bits: 1
footprint SOP08-5.3mm(1.27mm) (Small Outline Package 8 pin)
pins: 1 (~{RESET}/dW/ADC0/PCINT5) PB5 (io), 2 (XTAL1/CLKI/~{OC1B}/ADC3/PCINT3) PB3 (io), 3 (XTAL2/CLKO/OC1B/ADC2/PCINT4) PB4 (io), 4 GND (power), 5 (AREF/~{OC1A}/OC0A/AIN0/SDA/DI/MOSI/PCINT0) PB0 (io), 6 (OC1A/OC0B/AIN1/DO/MISO/PCINT1) PB1 (io), 7 (INT0/T0/SCL/USCK/SCK/ADC1/PCINT2) PB2 (io), 8 Vcc (power)

## ATtiny45V-10SU
designator U?
Atmel 8-bit AVR Microcontroller with 4 KB In-System Programmable Flash; ADC Channel: 4; Clock Frequency: 0 - 10 MHz; Debug: debugWire; EEPROM Memory: 256 B; Flash Memory: 4 KB; I/O Pins: 6; PWM Channel: 2; Serial USI: 1; Supply Voltage (Vdd): 1.8 - 5.5 V; Analog Comparator: *; SRAM Memory: 256 B; Timer 8 bits: 1
footprint SOP08-5.3mm(1.27mm) (Small Outline Package 8 pin)
pins: 1 (~{RESET}/dW/ADC0/PCINT5) PB5 (io), 2 (XTAL1/CLKI/~{OC1B}/ADC3/PCINT3) PB3 (io), 3 (XTAL2/CLKO/OC1B/ADC2/PCINT4) PB4 (io), 4 GND (power), 5 (AREF/~{OC1A}/OC0A/AIN0/SDA/DI/MOSI/PCINT0) PB0 (io), 6 (OC1A/OC0B/AIN1/DO/MISO/PCINT1) PB1 (io), 7 (INT0/T0/SCL/USCK/SCK/ADC1/PCINT2) PB2 (io), 8 Vcc (power)

## ATtiny45V-10XU
designator U?
Atmel 8-bit AVR Microcontroller with 4 KB In-System Programmable Flash; ADC Channel: 4; Clock Frequency: 0 - 10 MHz; Debug: debugWire; EEPROM Memory: 256 B; Flash Memory: 4 KB; I/O Pins: 6; PWM Channel: 2; Serial USI: 1; Supply Voltage (Vdd): 1.8 - 5.5 V; Analog Comparator: *; SRAM Memory: 256 B; Timer 8 bits: 1
footprint SOP08-4.4mm(0.65mm) (Thin Shrink Small Outline Package 8 pin)
pins: 1 (~{RESET}/dW/ADC0/PCINT5) PB5 (io), 2 (XTAL1/CLKI/~{OC1B}/ADC3/PCINT3) PB3 (io), 3 (XTAL2/CLKO/OC1B/ADC2/PCINT4) PB4 (io), 4 GND (power), 5 (AREF/~{OC1A}/OC0A/AIN0/SDA/DI/MOSI/PCINT0) PB0 (io), 6 (OC1A/OC0B/AIN1/DO/MISO/PCINT1) PB1 (io), 7 (INT0/T0/SCL/USCK/SCK/ADC1/PCINT2) PB2 (io), 8 Vcc (power)

## ATtiny85-20PU
designator U?
Atmel 8-bit AVR Microcontroller with 8 KB In-System Programmable Flash; ADC Channel: 4; Clock Frequency: 0 - 20 MHz; Debug: debugWire; EEPROM Memory: 512 B; Flash Memory: 8 KB; I/O Pins: 6; PWM Channel: 2; Serial USI: 1; Supply Voltage (Vdd): 2.7 - 5.5 V; Analog Comparator: *; SRAM Memory: 512 B; Timer 8 bits: 1
footprint DIP08-300(100) (DIP; 8 Leads; Row Spacing 7.62 mm; Pitch 2.54 mm; 3D CircuitWorks)
pins: 1 (~{RESET}/dW/ADC0/PCINT5) PB5 (io), 2 (XTAL1/CLKI/~{OC1B}/ADC3/PCINT3) PB3 (io), 3 (XTAL2/CLKO/OC1B/ADC2/PCINT4) PB4 (io), 4 GND (power), 5 (AREF/~{OC1A}/OC0A/AIN0/SDA/DI/MOSI/PCINT0) PB0 (io), 6 (OC1A/OC0B/AIN1/DO/MISO/PCINT1) PB1 (io), 7 (INT0/T0/SCL/USCK/SCK/ADC1/PCINT2) PB2 (io), 8 Vcc (power)